# Altium footprint library SAMTEC SMD.PcbLib: 165 footprints (part 16 of 17) (continued)
## SAMTEC_SFM-105-02-S-D-APTR [mm] "10 Contacts - Pitch 1.27mm - Top Entry, Dual Row Surface Mount Receptacle With Alignment Pin"
height 4.75
pads (12):
  rect 0.73x2.2 smd: 1(-2.54,1.365) 2(-2.54,-1.365) 3(-1.27,1.365) 4(-1.27,-1.365) 5(0,1.365) 6(0,-1.365) 7(1.27,1.365) 8(1.27,-1.365) 9(2.54,1.365) 10(2.54,-1.365)
  round 0.5 hole 1.4 unplated mask+0.45: MEC1(-4.13,0) MEC2(4.13,0)
Top Overlay:
  circle w0.25: c-3.592,2.35 r0.125
  circle w0.25: c-3.592,2.35 r0.125
  lines w0.2: -3.366,-0.564 -3.366,-1.524 -3.31,-1.524 ; -3.366,0.564 -3.366,1.524 -3.31,1.524 ; 3.31,-2.159 3.365,-2.159 3.365,-1.524 ; 3.31,-1.524 3.365,-1.524 ; 3.31,1.524 3.365,1.524 3.365,0.564 ; 3.365,-0.564 3.365,-1.524
Mechanical 8:
  lines w0.1: -4.63,0 -4.13,0 ; -4.13,-0.5 -4.13,0 ; -4.13,0.5 -4.13,0 ; -3.63,0 -4.13,0 ; -3.04,-1.365 -2.54,-1.365 ; -3.04,1.365 -2.54,1.365 ; -2.54,-1.865 -2.54,-1.365 ; -2.54,-0.865 -2.54,-1.365 ; -2.54,0.865 -2.54,1.365 ; -2.54,1.865 -2.54,1.365 ; -2.04,-1.365 -2.54,-1.365 ; -2.04,1.365 -2.54,1.365 ; -1.77,-1.365 -1.27,-1.365 ; -1.77,1.365 -1.27,1.365 ; -1.27,-1.865 -1.27,-1.365 ; -1.27,-0.865 -1.27,-1.365 ; -1.27,0.865 -1.27,1.365 ; -1.27,1.865 -1.27,1.365 ; -0.77,-1.365 -1.27,-1.365 ; -0.77,1.365 -1.27,1.365 ; -0.5,-1.365 0,-1.365 ; -0.5,0 0,0 ; -0.5,1.365 0,1.365 ; 0,-1.865 0,-1.365 ; 0,-0.865 0,-1.365 ; 0,-0.5 0,0 ; 0,0.5 0,0 ; 0,0.865 0,1.365 ; 0,1.865 0,1.365 ; 0.5,-1.365 0,-1.365 ; 0.5,0 0,0 ; 0.5,1.365 0,1.365 ; 0.77,-1.365 1.27,-1.365 ; 0.77,1.365 1.27,1.365 ; 1.27,-1.865 1.27,-1.365 ; 1.27,-0.865 1.27,-1.365 ; 1.27,0.865 1.27,1.365 ; 1.27,1.865 1.27,1.365 ; 1.77,-1.365 1.27,-1.365 ; 1.77,1.365 1.27,1.365 ; 2.04,-1.365 2.54,-1.365 ; 2.04,1.365 2.54,1.365 ; 2.54,-1.865 2.54,-1.365 ; 2.54,-0.865 2.54,-1.365 ; 2.54,0.865 2.54,1.365 ; 2.54,1.865 2.54,1.365 ; 3.04,-1.365 2.54,-1.365 ; 3.04,1.365 2.54,1.365 ; 3.63,0 4.13,0 ; 4.13,-0.5 4.13,0 ; 4.13,0.5 4.13,0 ; 4.63,0 4.13,0 ; -2.91,-2.475 -2.17,-2.475 -2.17,-0.254 -2.91,-0.254 -2.91,-2.475 ; -2.91,0.254 -2.91,2.475 -2.17,2.475 -2.17,0.254 -2.91,0.254 ; -1.64,-2.475 -0.9,-2.475 -0.9,-0.254 -1.64,-0.254 -1.64,-2.475 ; -1.64,0.254 -1.64,2.475 -0.9,2.475 -0.9,0.254 -1.64,0.254 ; -0.37,-2.475 0.37,-2.475 0.37,-0.254 -0.37,-0.254 -0.37,-2.475 ; -0.37,0.254 -0.37,2.475 0.37,2.475 0.37,0.254 -0.37,0.254 ; 0.9,-2.475 1.64,-2.475 1.64,-0.254 0.9,-0.254 0.9,-2.475 ; 0.9,0.254 0.9,2.475 1.64,2.475 1.64,0.254 0.9,0.254 ; 2.17,-2.475 2.91,-2.475 2.91,-0.254 2.17,-0.254 2.17,-2.475 ; 2.17,0.254 2.17,2.475 2.91,2.475 2.91,0.254 2.17,0.254
Mechanical 14:
  lines w0.1: -3.366,-0.635 -4.763,-0.635 -4.763,0.635 -3.366,0.635 ; 1.333,-1.524 1.333,-2.159 3.366,-2.159 3.366,1.524 -3.366,1.524 -3.366,-1.524 3.366,-1.524 ; 3.366,-0.635 4.763,-0.635 4.763,0.635 3.366,0.635 ; -3.048,-1.143 -3.048,-0.127 ; -3.048,-1.143 -2.032,-1.143 ; -3.048,-1.143 -2.819,-0.914 ; -3.048,-0.127 -2.032,-0.127 ; -3.048,-0.127 -2.819,-0.356 ; -3.048,0.127 -3.048,1.143 ; -3.048,0.127 -2.032,0.127 ; -3.048,0.127 -2.819,0.356 ; -3.048,1.143 -2.032,1.143 ; -3.048,1.143 -2.819,0.914 ; -2.819,-0.914 -2.819,-0.356 ; -2.819,-0.914 -2.261,-0.914 ; -2.819,-0.356 -2.261,-0.356 ; -2.819,0.356 -2.819,0.914 ; -2.819,0.356 -2.261,0.356 ; -2.819,0.914 -2.261,0.914 ; -2.261,-0.914 -2.032,-1.143 ; -2.261,-0.914 -2.261,-0.356 ; -2.261,-0.356 -2.032,-0.127 ; -2.261,0.356 -2.032,0.127 ; -2.261,0.356 -2.261,0.914 ; -2.261,0.914 -2.032,1.143 ; -2.032,-1.143 -2.032,-0.127 ; -2.032,0.127 -2.032,1.143 ; -1.778,-1.143 -1.778,-0.127 ; -1.778,-1.143 -0.762,-1.143 ; -1.778,-1.143 -1.549,-0.914 ; -1.778,-0.127 -0.762,-0.127 ; -1.778,-0.127 -1.549,-0.356 ; -1.778,0.127 -1.778,1.143 ; -1.778,0.127 -0.762,0.127 ; -1.778,0.127 -1.549,0.356 ; -1.778,1.143 -0.762,1.143 ; -1.778,1.143 -1.549,0.914 ; -1.549,-0.914 -1.549,-0.356 ; -1.549,-0.914 -0.991,-0.914 ; -1.549,-0.356 -0.991,-0.356 ; -1.549,0.356 -1.549,0.914 ; -1.549,0.356 -0.991,0.356 ; -1.549,0.914 -0.991,0.914 ; -0.991,-0.914 -0.762,-1.143 ; -0.991,-0.914 -0.991,-0.356 ; -0.991,-0.356 -0.762,-0.127 ; -0.991,0.356 -0.762,0.127 ; -0.991,0.356 -0.991,0.914 ; -0.991,0.914 -0.762,1.143 ; -0.762,-1.143 -0.762,-0.127 ; -0.762,0.127 -0.762,1.143 ; -0.508,-1.143 -0.508,-0.127 ; -0.508,-1.143 0.508,-1.143 ; -0.508,-1.143 -0.279,-0.914 ; -0.508,-0.127 0.508,-0.127 ; -0.508,-0.127 -0.279,-0.356 ; -0.508,0.127 -0.508,1.143 ; -0.508,0.127 0.508,0.127 ; -0.508,0.127 -0.279,0.356 ; -0.508,1.143 0.508,1.143 ; -0.508,1.143 -0.279,0.914 ; -0.279,-0.914 -0.279,-0.356 ; -0.279,-0.914 0.279,-0.914 ; -0.279,-0.356 0.279,-0.356 ; -0.279,0.356 -0.279,0.914 ; -0.279,0.356 0.279,0.356 ; -0.279,0.914 0.279,0.914 ; 0.279,-0.914 0.508,-1.143 ; 0.279,-0.914 0.279,-0.356 ; 0.279,-0.356 0.508,-0.127 ; 0.279,0.356 0.508,0.127 ; 0.279,0.356 0.279,0.914 ; 0.279,0.914 0.508,1.143 ; 0.508,-1.143 0.508,-0.127 ; 0.508,0.127 0.508,1.143 ; 0.762,-1.143 0.762,-0.127 ; 0.762,-1.143 1.778,-1.143 ; 0.762,-1.143 0.991,-0.914 ; 0.762,-0.127 1.778,-0.127 ; 0.762,-0.127 0.991,-0.356 ; 0.762,0.127 0.762,1.143 ; 0.762,0.127 1.778,0.127 ; 0.762,0.127 0.991,0.356 ; 0.762,1.143 1.778,1.143 ; 0.762,1.143 0.991,0.914 ; 0.991,-0.914 0.991,-0.356 ; 0.991,-0.914 1.549,-0.914 ; 0.991,-0.356 1.549,-0.356 ; 0.991,0.356 0.991,0.914 ; 0.991,0.356 1.549,0.356 ; 0.991,0.914 1.549,0.914 ; 1.549,-0.914 1.778,-1.143 ; 1.549,-0.914 1.549,-0.356 ; 1.549,-0.356 1.778,-0.127 ; 1.549,0.356 1.778,0.127 ; 1.549,0.356 1.549,0.914 ; 1.549,0.914 1.778,1.143 ; 1.778,-1.143 1.778,-0.127 ; 1.778,0.127 1.778,1.143 ; 2.032,-1.143 2.032,-0.127 ; 2.032,-1.143 3.048,-1.143 ; 2.032,-1.143 2.261,-0.914 ; 2.032,-0.127 3.048,-0.127 ; 2.032,-0.127 2.261,-0.356 ; 2.032,0.127 2.032,1.143 ; 2.032,0.127 3.048,0.127 ; 2.032,0.127 2.261,0.356 ; 2.032,1.143 3.048,1.143 ; 2.032,1.143 2.261,0.914 ; 2.261,-0.914 2.261,-0.356 ; 2.261,-0.914 2.819,-0.914 ; 2.261,-0.356 2.819,-0.356 ; 2.261,0.356 2.261,0.914 ; 2.261,0.356 2.819,0.356 ; 2.261,0.914 2.819,0.914 ; 2.819,-0.914 3.048,-1.143 ; 2.819,-0.914 2.819,-0.356 ; 2.819,-0.356 3.048,-0.127 ; 2.819,0.356 3.048,0.127 ; 2.819,0.356 2.819,0.914 ; 2.819,0.914 3.048,1.143 ; 3.048,-1.143 3.048,-0.127 ; 3.048,0.127 3.048,1.143
Mechanical 15:
  lines w0.05: -5.013,-2.725 -5.013,2.725 5.013,2.725 5.013,-2.725 -5.013,-2.725
3D body "SAMTEC_SFM-105-02-S-D-APTR.stp": height 4.7, standoff -1.14, extent -4.765,-2.159 4.765,2.096

## SAMTEC_SFM-125-02-S-D-APTR [mm] "50 Contacts - Pitch 1.27mm - Top Entry, Dual Row Surface Mount Receptacle With Alignment Pin"
height 4.75
pads (52):
  rect 0.73x2.2 smd: 1(-15.24,1.365) 2(-15.24,-1.365) 3(-13.97,1.365) 4(-13.97,-1.365) 5(-12.7,1.365) 6(-12.7,-1.365) 7(-11.43,1.365) 8(-11.43,-1.365) 9(-10.16,1.365) 10(-10.16,-1.365) 11(-8.89,1.365) 12(-8.89,-1.365) 13(-7.62,1.365) 14(-7.62,-1.365) 15(-6.35,1.365) 16(-6.35,-1.365) 17(-5.08,1.365) 18(-5.08,-1.365) 19(-3.81,1.365) 20(-3.81,-1.365) 21(-2.54,1.365) 22(-2.54,-1.365) 23(-1.27,1.365) 24(-1.27,-1.365) 25(0,1.365) 26(0,-1.365) 27(1.27,1.365) 28(1.27,-1.365) 29(2.54,1.365) 30(2.54,-1.365) 31(3.81,1.365) 32(3.81,-1.365) 33(5.08,1.365) 34(5.08,-1.365) 35(6.35,1.365) 36(6.35,-1.365) 37(7.62,1.365) 38(7.62,-1.365) 39(8.89,1.365) 40(8.89,-1.365) 41(10.16,1.365) 42(10.16,-1.365) 43(11.43,1.365) 44(11.43,-1.365) 45(12.7,1.365) 46(12.7,-1.365) 47(13.97,1.365) 48(13.97,-1.365) 49(15.24,1.365) 50(15.24,-1.365)
  round 0.5 hole 1.4 unplated mask+0.45: MEC1(-16.83,0) MEC2(16.83,0)
Top Overlay:
  circle w0.25: c-16.292,2.35 r0.125
  circle w0.25: c-16.292,2.35 r0.125
  lines w0.2: -16.066,-0.564 -16.066,-1.524 -16.01,-1.524 ; -16.066,0.564 -16.066,1.524 -16.01,1.524 ; 16.01,-2.159 16.066,-2.159 16.066,-1.524 ; 16.01,-1.524 16.066,-1.524 ; 16.01,1.524 16.066,1.524 16.066,0.564 ; 16.066,-0.564 16.066,-1.524
Mechanical 8:
  drawing of 412 lines, arcs and shapes, not listed
Mechanical 14:
  drawing of 614 lines, arcs and shapes, not listed
Mechanical 15:
  lines w0.05: -17.713,-2.725 -17.713,2.725 17.713,2.725 17.713,-2.725 -17.713,-2.725
3D body "SAMTEC_SFM-125-02-S-D-APTR.stp": height 4.7, standoff -1.14, extent -17.465,-2.159 17.465,2.096

## SAMTEC_SFM-130-02-S-D-A [mm] "60 Contacts - Pitch 1.27mm - Top Entry, Dual Row Surface Mount Receptacle With Alignment Pin"
height 4.75
pads (62):
  rect 0.73x2.2 smd: 1(-18.415,1.365) 2(-18.415,-1.365) 3(-17.145,1.365) 4(-17.145,-1.365) 5(-15.875,1.365) 6(-15.875,-1.365) 7(-14.605,1.365) 8(-14.605,-1.365) 9(-13.335,1.365) 10(-13.335,-1.365) 11(-12.065,1.365) 12(-12.065,-1.365) 13(-10.795,1.365) 14(-10.795,-1.365) 15(-9.525,1.365) 16(-9.525,-1.365) 17(-8.255,1.365) 18(-8.255,-1.365) 19(-6.985,1.365) 20(-6.985,-1.365) 21(-5.715,1.365) 22(-5.715,-1.365) 23(-4.445,1.365) 24(-4.445,-1.365) 25(-3.175,1.365) 26(-3.175,-1.365) 27(-1.905,1.365) 28(-1.905,-1.365) 29(-0.635,1.365) 30(-0.635,-1.365) 31(0.635,1.365) 32(0.635,-1.365) 33(1.905,1.365) 34(1.905,-1.365) 35(3.175,1.365) 36(3.175,-1.365) 37(4.445,1.365) 38(4.445,-1.365) 39(5.715,1.365) 40(5.715,-1.365) 41(6.985,1.365) 42(6.985,-1.365) 43(8.255,1.365) 44(8.255,-1.365) 45(9.525,1.365) 46(9.525,-1.365) 47(10.795,1.365) 48(10.795,-1.365) 49(12.065,1.365) 50(12.065,-1.365) 51(13.335,1.365) 52(13.335,-1.365) 53(14.605,1.365) 54(14.605,-1.365) 55(15.875,1.365) 56(15.875,-1.365) 57(17.145,1.365) 58(17.145,-1.365) 59(18.415,1.365) 60(18.415,-1.365)
  round 0.5 hole 1.4 unplated mask+0.45: MEC1(-20,0) MEC2(20,0)
Top Overlay:
  circle w0.25: c-19.467,2.35 r0.125
  circle w0.25: c-19.467,2.35 r0.125
  lines w0.2: -19.236,-0.564 -19.236,-1.524 -19.18,-1.524 ; -19.236,0.564 -19.236,1.524 -19.18,1.524 ; 19.18,-2.159 19.236,-2.159 19.236,-1.524 ; 19.18,-1.524 19.236,-1.524 ; 19.18,1.524 19.236,1.524 19.236,0.564 ; 19.236,-0.564 19.236,-1.524
Mechanical 8:
  drawing of 209 lines, arcs and shapes, not listed
Mechanical 14:
  drawing of 741 lines, arcs and shapes, not listed
Mechanical 15:
  lines w0.1: -20.888,-2.725 -20.888,2.725 20.888,2.725 20.888,-2.725 -20.888,-2.725
3D body "SAMTEC_SFM-130-02-S-D-A.stp": height 4.7, standoff -1.14, extent -20.637,-2.159 20.638,2.096

## SAMTEC_SFML-130-T2-S-D-A [mm] "60 Contacts - Pitch 1.27mm - Top Entry, Dual Row Surface Mount Receptacle With Alignment Pin And Locking Tab"
height 4.57
pads (62):
  rect 0.73x2.2 smd: 1(-18.415,1.365) 2(-18.415,-1.365) 3(-17.145,1.365) 4(-17.145,-1.365) 5(-15.875,1.365) 6(-15.875,-1.365) 7(-14.605,1.365) 8(-14.605,-1.365) 9(-13.335,1.365) 10(-13.335,-1.365) 11(-12.065,1.365) 12(-12.065,-1.365) 13(-10.795,1.365) 14(-10.795,-1.365) 15(-9.525,1.365) 16(-9.525,-1.365) 17(-8.255,1.365) 18(-8.255,-1.365) 19(-6.985,1.365) 20(-6.985,-1.365) 21(-5.715,1.365) 22(-5.715,-1.365) 23(-4.445,1.365) 24(-4.445,-1.365) 25(-3.175,1.365) 26(-3.175,-1.365) 27(-1.905,1.365) 28(-1.905,-1.365) 29(-0.635,1.365) 30(-0.635,-1.365) 31(0.635,1.365) 32(0.635,-1.365) 33(1.905,1.365) 34(1.905,-1.365) 35(3.175,1.365) 36(3.175,-1.365) 37(4.445,1.365) 38(4.445,-1.365) 39(5.715,1.365) 40(5.715,-1.365) 41(6.985,1.365) 42(6.985,-1.365) 43(8.255,1.365) 44(8.255,-1.365) 45(9.525,1.365) 46(9.525,-1.365) 47(10.795,1.365) 48(10.795,-1.365) 49(12.065,1.365) 50(12.065,-1.365) 51(13.335,1.365) 52(13.335,-1.365) 53(14.605,1.365) 54(14.605,-1.365) 55(15.875,1.365) 56(15.875,-1.365) 57(17.145,1.365) 58(17.145,-1.365) 59(18.415,1.365) 60(18.415,-1.365)
  round 0.5 hole 1.4 unplated mask+0.45: MEC1(-20,0) MEC2(20,0)
Top Overlay:
  circle w0.25: c-19.467,2.35 r0.125
  circle w0.25: c-19.467,2.35 r0.125
  lines w0.2: -19.236,-0.564 -19.236,-1.524 -19.18,-1.524 ; -19.236,0.564 -19.236,1.524 -19.18,1.524 ; 19.18,-2.159 19.236,-2.159 19.236,-1.524 ; 19.18,-1.524 19.236,-1.524 ; 19.18,1.524 19.236,1.524 19.236,0.564 ; 19.236,-0.564 19.236,-1.524
Mechanical 8:
  drawing of 209 lines, arcs and shapes, not listed
Mechanical 14:
  drawing of 746 lines, arcs and shapes, not listed
Mechanical 15:
  lines w0.1: -20.888,-2.725 20.888,-2.725 20.888,2.725 -20.888,2.725 -20.888,-2.725
3D body "SAMTEC_SFML-130-T2-S-D-A.stp": height 4.7, standoff -1.14, extent -20.637,-2.21 20.638,2.096

## SAMTEC_SS4-20-3.00-L-D-K-TR [mm] "40 Contacts - Pitch 0.40 mm Razor Beam Ultra Fine Pitch Low Profile Socket Strip"
height 3.5
pads (40):
  rect 0.23x0.93 smd paste-0.02 mask+0.05: 1(3.8,2.335) 2(3.8,-2.335) 3(3.4,2.335) 4(3.4,-2.335) 5(3,2.335) 6(3,-2.335) 7(2.6,2.335) 8(2.6,-2.335) 9(2.2,2.335) 10(2.2,-2.335) 11(1.8,2.335) 12(1.8,-2.335) 13(1.4,2.335) 14(1.4,-2.335) 15(1,2.335) 16(1,-2.335) 17(0.6,2.335) 18(0.6,-2.335) 19(0.2,2.335) 20(0.2,-2.335) 21(-0.2,2.335) 22(-0.2,-2.335) 23(-0.6,2.335) 24(-0.6,-2.335) 25(-1,2.335) 26(-1,-2.335) 27(-1.4,2.335) 28(-1.4,-2.335) 29(-1.8,2.335) 30(-1.8,-2.335) 31(-2.2,2.335) 32(-2.2,-2.335) 33(-2.6,2.335) 34(-2.6,-2.335) 35(-3,2.335) 36(-3,-2.335) 37(-3.4,2.335) 38(-3.4,-2.335) 39(-3.8,2.335) 40(-3.8,-2.335)
Top Overlay:
  drawing of 240 lines, arcs and shapes, not listed
  text "1" at 5.1,1.375 h1
  text "2" at 5.075,-2.375 h1
Mechanical 8:
  drawing of 244 lines, arcs and shapes, not listed
Mechanical 14:
  drawing of 412 lines, arcs and shapes, not listed
  text "1" at 5.1,1.375 h1
  text "2" at 5.075,-2.375 h1
Mechanical 15:
  lines w0.05: -5.81,-2.425 -4.165,-2.425 -4.165,-3.05 4.165,-3.05 4.165,-2.425 4.88,-2.425 4.88,-1.15 5.48,-1.15 5.48,-0.75 6.23,-0.75 6.23,0.75 5.48,0.75 5.48,1.15 4.88,1.15 4.88,2.425 4.165,2.425 4.165,3.05 -4.165,3.05 -4.165,2.425 -5.81,2.425 -5.81,-2.425
3D body "SAMTEC_SS4-20-3.00-L-D-K-TR.stp": height 3.5, standoff 0, extent -5.56,-2.5 5.98,2.5

## SAMTEC_SS4-20-3.00-L-D-K-TR_A [mm] "40 Contacts - Pitch 0.40 mm Razor Beam Ultra Fine Pitch Low Profile Socket Strip"
height 3.5
pads (40):
  rect 0.23x0.93 smd paste-0.02 mask+0.05: 1(3.8,2.335) 2(3.4,2.335) 3(3,2.335) 4(2.6,2.335) 5(2.2,2.335) 6(1.8,2.335) 7(1.4,2.335) 8(1,2.335) 9(0.6,2.335) 10(0.2,2.335) 11(-0.2,2.335) 12(-0.6,2.335) 13(-1,2.335) 14(-1.4,2.335) 15(-1.8,2.335) 16(-2.2,2.335) 17(-2.6,2.335) 18(-3,2.335) 19(-3.4,2.335) 20(-3.8,2.335) 21(-3.8,-2.335) 22(-3.4,-2.335) 23(-3,-2.335) 24(-2.6,-2.335) 25(-2.2,-2.335) 26(-1.8,-2.335) 27(-1.4,-2.335) 28(-1,-2.335) 29(-0.6,-2.335) 30(-0.2,-2.335) 31(0.2,-2.335) 32(0.6,-2.335) 33(1,-2.335) 34(1.4,-2.335) 35(1.8,-2.335) 36(2.2,-2.335) 37(2.6,-2.335) 38(3,-2.335) 39(3.4,-2.335) 40(3.8,-2.335)
Top Overlay:
  drawing of 240 lines, arcs and shapes, not listed
  text "40" at 5.075,-2.375 h1
  text "1" at 5.1,1.375 h1
Mechanical 8:
  drawing of 244 lines, arcs and shapes, not listed
Mechanical 14:
  drawing of 412 lines, arcs and shapes, not listed
  text "40" at 5.075,-2.375 h1
  text "1" at 5.1,1.375 h1
Mechanical 15:
  lines w0.05: -5.81,-2.425 -5.81,2.425 -4.165,2.425 -4.165,3.05 4.165,3.05 4.165,2.425 4.88,2.425 4.88,1.15 5.48,1.15 5.48,0.75 6.23,0.75 6.23,-0.75 5.48,-0.75 5.48,-1.15 4.88,-1.15 4.88,-2.425 4.165,-2.425 4.165,-3.05 -4.165,-3.05 -4.165,-2.425 -5.81,-2.425
3D body "SAMTEC_SS4-20-3.00-L-D-K-TR.stp": height 3.5, standoff 0, extent -5.56,-2.5 5.98,2.5

## SAMTEC_SS4-20-3.00-L-D-TR [mm] "40 Contacts - Pitch 0.40 mm Razor Beam Ultra Fine Pitch Low Profile Socket Strip"
height 3.5
pads (40):
  rect 0.23x0.93 smd paste-0.02 mask+0.05: 1(3.8,2.335) 2(3.8,-2.335) 3(3.4,2.335) 4(3.4,-2.335) 5(3,2.335) 6(3,-2.335) 7(2.6,2.335) 8(2.6,-2.335) 9(2.2,2.335) 10(2.2,-2.335) 11(1.8,2.335) 12(1.8,-2.335) 13(1.4,2.335) 14(1.4,-2.335) 15(1,2.335) 16(1,-2.335) 17(0.6,2.335) 18(0.6,-2.335) 19(0.2,2.335) 20(0.2,-2.335) 21(-0.2,2.335) 22(-0.2,-2.335) 23(-0.6,2.335) 24(-0.6,-2.335) 25(-1,2.335) 26(-1,-2.335) 27(-1.4,2.335) 28(-1.4,-2.335) 29(-1.8,2.335) 30(-1.8,-2.335) 31(-2.2,2.335) 32(-2.2,-2.335) 33(-2.6,2.335) 34(-2.6,-2.335) 35(-3,2.335) 36(-3,-2.335) 37(-3.4,2.335) 38(-3.4,-2.335) 39(-3.8,2.335) 40(-3.8,-2.335)
Top Overlay:
  drawing of 240 lines, arcs and shapes, not listed
  text "2" at 5.075,-2.375 h1
  text "1" at 5.1,1.375 h1
Mechanical 8:
  drawing of 244 lines, arcs and shapes, not listed
Mechanical 14:
  drawing of 412 lines, arcs and shapes, not listed
  text "2" at 5.075,-2.375 h1
  text "1" at 5.1,1.375 h1
Mechanical 15:
  lines w0.05: -5.81,-2.425 -4.165,-2.425 -4.165,-3.05 4.165,-3.05 4.165,-2.425 4.88,-2.425 4.88,-1.15 5.48,-1.15 5.48,-0.75 6.23,-0.75 6.23,0.75 5.48,0.75 5.48,1.15 4.88,1.15 4.88,2.425 4.165,2.425 4.165,3.05 -4.165,3.05 -4.165,2.425 -5.81,2.425 -5.81,-2.425
3D body "SAMTEC_SS4-20-3.00-L-D-TR.stp": height 3.5, standoff 0, extent -5.56,-2.5 5.98,2.5

## SAMTEC_SS4-40-3.00-L-D-K-TR [mm] "80 Contacts - Pitch 0.40 mm Razor Beam Ultra Fine Pitch Low Profile Socket Strip"
height 3.5
pads (80):
  rect 0.23x0.93 smd paste-0.02 mask+0.05: 1(7.8,2.335) 2(7.8,-2.335) 3(7.4,2.335) 4(7.4,-2.335) 5(7,2.335) 6(7,-2.335) 7(6.6,2.335) 8(6.6,-2.335) 9(6.2,2.335) 10(6.2,-2.335) 11(5.8,2.335) 12(5.8,-2.335) 13(5.4,2.335) 14(5.4,-2.335) 15(5,2.335) 16(5,-2.335) 17(4.6,2.335) 18(4.6,-2.335) 19(4.2,2.335) 20(4.2,-2.335) 21(3.8,2.335) 22(3.8,-2.335) 23(3.4,2.335) 24(3.4,-2.335) 25(3,2.335) 26(3,-2.335) 27(2.6,2.335) 28(2.6,-2.335) 29(2.2,2.335) 30(2.2,-2.335) 31(1.8,2.335) 32(1.8,-2.335) 33(1.4,2.335) 34(1.4,-2.335) 35(1,2.335) 36(1,-2.335) 37(0.6,2.335) 38(0.6,-2.335) 39(0.2,2.335) 40(0.2,-2.335) 41(-0.2,2.335) 42(-0.2,-2.335) 43(-0.6,2.335) 44(-0.6,-2.335) 45(-1,2.335) 46(-1,-2.335) 47(-1.4,2.335) 48(-1.4,-2.335) 49(-1.8,2.335) 50(-1.8,-2.335) 51(-2.2,2.335) 52(-2.2,-2.335) 53(-2.6,2.335) 54(-2.6,-2.335) 55(-3,2.335) 56(-3,-2.335) 57(-3.4,2.335) 58(-3.4,-2.335) 59(-3.8,2.335) 60(-3.8,-2.335) 61(-4.2,2.335) 62(-4.2,-2.335) 63(-4.6,2.335) 64(-4.6,-2.335) 65(-5,2.335) 66(-5,-2.335) 67(-5.4,2.335) 68(-5.4,-2.335) 69(-5.8,2.335) 70(-5.8,-2.335) 71(-6.2,2.335) 72(-6.2,-2.335) 73(-6.6,2.335) 74(-6.6,-2.335) 75(-7,2.335) 76(-7,-2.335) 77(-7.4,2.335) 78(-7.4,-2.335) 79(-7.8,2.335) 80(-7.8,-2.335)
Top Overlay:
  drawing of 400 lines, arcs and shapes, not listed
  text "1" at 9.1,1.375 h1
  text "2" at 9.075,-2.375 h1
Mechanical 8:
  drawing of 514 lines, arcs and shapes, not listed
Mechanical 14:
  drawing of 732 lines, arcs and shapes, not listed
  text "1" at 9.1,1.375 h1
  text "2" at 9.075,-2.375 h1
Mechanical 15:
  lines w0.05: -9.81,-2.425 -9.81,2.425 -8.165,2.425 -8.165,3.05 8.165,3.05 8.165,2.425 8.88,2.425 8.88,1.15 9.48,1.15 9.48,0.75 10.23,0.75 10.23,-0.75 9.48,-0.75 9.48,-1.15 8.88,-1.15 8.88,-2.425 8.165,-2.425 8.165,-3.05 -8.165,-3.05 -8.165,-2.425 -9.81,-2.425
3D body "SAMTEC_SS4-40-3.00-L-D-K-TR.stp": height 3.5, standoff 0, extent -9.56,-2.5 9.98,2.5

## SAMTEC_SS4-40-3.00-L-D-K-TR_a [mm] "80 Contacts - Pitch 0.40 mm Razor Beam Ultra Fine Pitch Low Profile Socket Strip"
height 3.5
pads (80):
  rect 0.23x0.93 smd paste-0.02 mask+0.05: 1(7.8,2.335) 2(7.4,2.335) 3(7,2.335) 4(6.6,2.335) 5(6.2,2.335) 6(5.8,2.335) 7(5.4,2.335) 8(5,2.335) 9(4.6,2.335) 10(4.2,2.335) 11(3.8,2.335) 12(3.4,2.335) 13(3,2.335) 14(2.6,2.335) 15(2.2,2.335) 16(1.8,2.335) 17(1.4,2.335) 18(1,2.335) 19(0.6,2.335) 20(0.2,2.335) 21(-0.2,2.335) 22(-0.6,2.335) 23(-1,2.335) 24(-1.4,2.335) 25(-1.8,2.335) 26(-2.2,2.335) 27(-2.6,2.335) 28(-3,2.335) 29(-3.4,2.335) 30(-3.8,2.335) 31(-4.2,2.335) 32(-4.6,2.335) 33(-5,2.335) 34(-5.4,2.335) 35(-5.8,2.335) 36(-6.2,2.335) 37(-6.6,2.335) 38(-7,2.335) 39(-7.4,2.335) 40(-7.8,2.335) 41(-7.8,-2.335) 42(-7.4,-2.335) 43(-7,-2.335) 44(-6.6,-2.335) 45(-6.2,-2.335) 46(-5.8,-2.335) 47(-5.4,-2.335) 48(-5,-2.335) 49(-4.6,-2.335) 50(-4.2,-2.335) 51(-3.8,-2.335) 52(-3.4,-2.335) 53(-3,-2.335) 54(-2.6,-2.335) 55(-2.2,-2.335) 56(-1.8,-2.335) 57(-1.4,-2.335) 58(-1,-2.335) 59(-0.6,-2.335) 60(-0.2,-2.335) 61(0.2,-2.335) 62(0.6,-2.335) 63(1,-2.335) 64(1.4,-2.335) 65(1.8,-2.335) 66(2.2,-2.335) 67(2.6,-2.335) 68(3,-2.335) 69(3.4,-2.335) 70(3.8,-2.335) 71(4.2,-2.335) 72(4.6,-2.335) 73(5,-2.335) 74(5.4,-2.335) 75(5.8,-2.335) 76(6.2,-2.335) 77(6.6,-2.335) 78(7,-2.335) 79(7.4,-2.335) 80(7.8,-2.335)
Top Overlay:
  drawing of 400 lines, arcs and shapes, not listed
  text "1" at 9.1,1.375 h1
Mechanical 8:
  drawing of 514 lines, arcs and shapes, not listed
Mechanical 14:
  drawing of 732 lines, arcs and shapes, not listed
  text "80" at 10.075,-3.025 h1
  text "1" at 9.1,1.375 h1
Mechanical 15:
  lines w0.05: -9.81,-2.425 -8.165,-2.425 -8.165,-3.05 8.165,-3.05 8.165,-2.425 8.88,-2.425 8.88,-1.15 9.48,-1.15 9.48,-0.75 10.23,-0.75 10.23,0.75 9.48,0.75 9.48,1.15 8.88,1.15 8.88,2.425 8.165,2.425 8.165,3.05 -8.165,3.05 -8.165,2.425 -9.81,2.425 -9.81,-2.425
3D body "SAMTEC_SS4-40-3.00-L-D-K-TR.stp": height 3.5, standoff 0, extent -9.56,-2.5 9.98,2.5

## SAMTEC_ST4-20-1.00-L-D-P-TR [mm] "40 Contacts - Pitch 0.40 mm Razor Beam Ultra Fine Pitch Low Profile Header Strip"
height 3.08
pads (40):
  rect 0.23x1.2 smd paste-0.02 mask+0.05: 1(-3.8,1.71) 2(-3.8,-1.71) 3(-3.4,1.71) 4(-3.4,-1.71) 5(-3,1.71) 6(-3,-1.71) 7(-2.6,1.71) 8(-2.6,-1.71) 9(-2.2,1.71) 10(-2.2,-1.71) 11(-1.8,1.71) 12(-1.8,-1.71) 13(-1.4,1.71) 14(-1.4,-1.71) 15(-1,1.71) 16(-1,-1.71) 17(-0.6,1.71) 18(-0.6,-1.71) 19(-0.2,1.71) 20(-0.2,-1.71) 21(0.2,1.71) 22(0.2,-1.71) 23(0.6,1.71) 24(0.6,-1.71) 25(1,1.71) 26(1,-1.71) 27(1.4,1.71) 28(1.4,-1.71) 29(1.8,1.71) 30(1.8,-1.71) 31(2.2,1.71) 32(2.2,-1.71) 33(2.6,1.71) 34(2.6,-1.71) 35(3,1.71) 36(3,-1.71) 37(3.4,1.71) 38(3.4,-1.71) 39(3.8,1.71) 40(3.8,-1.71)
Top Overlay:
  drawing of 210 lines, arcs and shapes, not listed
Mechanical 8:
  drawing of 244 lines, arcs and shapes, not listed
Mechanical 14:
  drawing of 219 lines, arcs and shapes, not listed
Mechanical 15:
  lines w0.05: -5.125,-2.1 -5.125,2.1 -4.165,2.1 -4.165,2.56 4.375,2.56 4.375,0.928 4.95,0.928 4.95,-0.928 4.375,-0.928 4.375,-2.56 -4.165,-2.56 -4.165,-2.1 -5.125,-2.1
3D body "SAMTEC_ST4-20-1.00-L-D-P-TR.stp": height 3.08, standoff 0, extent -4.875,-1.998 4.7,1.998

## SAMTEC_ST4-40-1.00-L-D-P-TR [mm] "80 Contacts - Pitch 0.40 mm Razor Beam Ultra Fine Pitch Low Profile Header Strip"
height 3.08
pads (80):
  rect 0.23x1.2 smd paste-0.02 mask+0.05: 1(-7.8,1.71) 2(-7.8,-1.71) 3(-7.4,1.71) 4(-7.4,-1.71) 5(-7,1.71) 6(-7,-1.71) 7(-6.6,1.71) 8(-6.6,-1.71) 9(-6.2,1.71) 10(-6.2,-1.71) 11(-5.8,1.71) 12(-5.8,-1.71) 13(-5.4,1.71) 14(-5.4,-1.71) 15(-5,1.71) 16(-5,-1.71) 17(-4.6,1.71) 18(-4.6,-1.71) 19(-4.2,1.71) 20(-4.2,-1.71) 21(-3.8,1.71) 22(-3.8,-1.71) 23(-3.4,1.71) 24(-3.4,-1.71) 25(-3,1.71) 26(-3,-1.71) 27(-2.6,1.71) 28(-2.6,-1.71) 29(-2.2,1.71) 30(-2.2,-1.71) 31(-1.8,1.71) 32(-1.8,-1.71) 33(-1.4,1.71) 34(-1.4,-1.71) 35(-1,1.71) 36(-1,-1.71) 37(-0.6,1.71) 38(-0.6,-1.71) 39(-0.2,1.71) 40(-0.2,-1.71) 41(0.2,1.71) 42(0.2,-1.71) 43(0.6,1.71) 44(0.6,-1.71) 45(1,1.71) 46(1,-1.71) 47(1.4,1.71) 48(1.4,-1.71) 49(1.8,1.71) 50(1.8,-1.71) 51(2.2,1.71) 52(2.2,-1.71) 53(2.6,1.71) 54(2.6,-1.71) 55(3,1.71) 56(3,-1.71) 57(3.4,1.71) 58(3.4,-1.71) 59(3.8,1.71) 60(3.8,-1.71) 61(4.2,1.71) 62(4.2,-1.71) 63(4.6,1.71) 64(4.6,-1.71) 65(5,1.71) 66(5,-1.71) 67(5.4,1.71) 68(5.4,-1.71) 69(5.8,1.71) 70(5.8,-1.71) 71(6.2,1.71) 72(6.2,-1.71) 73(6.6,1.71) 74(6.6,-1.71) 75(7,1.71) 76(7,-1.71) 77(7.4,1.71) 78(7.4,-1.71) 79(7.8,1.71) 80(7.8,-1.71)
Top Overlay:
  drawing of 358 lines, arcs and shapes, not listed
Mechanical 8:
  drawing of 488 lines, arcs and shapes, not listed
Mechanical 14:
  drawing of 367 lines, arcs and shapes, not listed
Mechanical 15:
  lines w0.05: -8.95,-2.56 -8.95,2.56 8.375,2.56 8.375,0.928 8.95,0.928 8.95,-0.928 8.375,-0.928 8.375,-2.56 -8.95,-2.56
3D body "SAMTEC_ST4-40-1.00-L-D-P-TR.stp": height 3.08, standoff 0, extent -8.875,-1.998 8.7,1.998

## SAMTEC_T2M-107-01-L-D-SM-K-TR [mm] "14 Contacts, Pitch 2mm, Dual Row Surface Mount Tiger Eye High-reliability Cable Header"
height 6.55
pads (14):
  rect 1.02x3.8 smd: 1(-6,-2.535) 2(-6,2.535) 3(-4,-2.535) 4(-4,2.535) 5(-2,-2.535) 6(-2,2.535) 7(0,-2.535) 8(0,2.535) 9(2,-2.535) 10(2,2.535) 11(4,-2.535) 12(4,2.535) 13(6,-2.535) 14(6,2.535)
Top Overlay:
  circle w0.25: c-6,-4.985 r0.125
  lines w0.2: -9.512,1.207 -9.077,1.207 ; -9.077,-1.003 -8.793,-1.003 ; -9.077,1.003 -8.793,1.003 ; -8.793,-1.207 -7.275,-1.207 ; -8.793,1.207 -7.275,1.207 ; -8.312,-1.207 -8.312,-2 -9.512,-2 -9.512,2 -8.312,2 -8.312,1.207 ; -6.86,-3.915 -8.064,-3.915 -8.064,-2.735 -9.837,-2.735 -9.837,3.015 -8.066,3.015 -8.066,3.523 -7.177,3.523 -7.177,3.015 -6.86,3.015 ; -6.86,-3.155 -7.275,-3.155 -7.275,2.255 -6.86,2.255 ; 6.86,-3.915 8.064,-3.915 8.064,-2.735 9.837,-2.735 9.837,3.015 8.066,3.015 8.066,3.523 7.177,3.523 7.177,3.015 6.86,3.015 ; 6.86,-3.155 7.275,-3.155 7.275,2.255 6.86,2.255 ; 7.275,-1.207 8.793,-1.207 ; 7.275,1.207 8.793,1.207 ; 8.312,-1.207 8.312,-2 9.512,-2 9.512,2 8.312,2 8.312,1.207 ; 8.793,-1.003 9.077,-1.003 ; 8.793,1.003 9.077,1.003 ; 9.077,-1.207 9.512,-1.207 ; 9.077,1.207 9.512,1.207 ; -9.077,-1.702 -8.793,-1.702 -8.793,1.702 -9.077,1.702 -9.077,-1.702 ; 8.793,-1.702 8.793,1.702 9.077,1.702 9.077,-1.702 8.793,-1.702
Mechanical 8:
  lines w0.05: -0.5,0 0,0 ; 0,-0.5 0,0 ; 0,0.5 0,0 ; 0.5,0 0,0 ; -6.51,-4.435 -6,-2.535 -5.49,-4.435 ; -6.51,-4.435 -6.51,-0.635 -5.49,-0.635 -5.49,-4.435 ; -6.51,-4.435 -5.49,-4.435 ; -6.51,4.435 -6,2.535 -5.49,4.435 ; -6.51,4.435 -6.51,0.635 -5.49,0.635 -5.49,4.435 ; -6.51,4.435 -5.49,4.435 ; -4.51,-4.435 -4,-2.535 -3.49,-4.435 ; -4.51,-4.435 -4.51,-0.635 -3.49,-0.635 -3.49,-4.435 ; -4.51,-4.435 -3.49,-4.435 ; -4.51,4.435 -4,2.535 -3.49,4.435 ; -4.51,4.435 -4.51,0.635 -3.49,0.635 -3.49,4.435 ; -4.51,4.435 -3.49,4.435 ; -2.51,-4.435 -2,-2.535 -1.49,-4.435 ; -2.51,-4.435 -2.51,-0.635 -1.49,-0.635 -1.49,-4.435 ; -2.51,-4.435 -1.49,-4.435 ; -2.51,4.435 -2,2.535 -1.49,4.435 ; -2.51,4.435 -2.51,0.635 -1.49,0.635 -1.49,4.435 ; -2.51,4.435 -1.49,4.435 ; -0.51,-4.435 0,-2.535 0.51,-4.435 ; -0.51,-4.435 -0.51,-0.635 0.51,-0.635 0.51,-4.435 ; -0.51,-4.435 0.51,-4.435 ; -0.51,4.435 0,2.535 0.51,4.435 ; -0.51,4.435 -0.51,0.635 0.51,0.635 0.51,4.435 ; -0.51,4.435 0.51,4.435 ; 1.49,-4.435 2,-2.535 2.51,-4.435 ; 1.49,-4.435 1.49,-0.635 2.51,-0.635 2.51,-4.435 ; 1.49,-4.435 2.51,-4.435 ; 1.49,4.435 2,2.535 2.51,4.435 ; 1.49,4.435 1.49,0.635 2.51,0.635 2.51,4.435 ; 1.49,4.435 2.51,4.435 ; 3.49,-4.435 4,-2.535 4.51,-4.435 ; 3.49,-4.435 3.49,-0.635 4.51,-0.635 4.51,-4.435 ; 3.49,-4.435 4.51,-4.435 ; 3.49,4.435 4,2.535 4.51,4.435 ; 3.49,4.435 3.49,0.635 4.51,0.635 4.51,4.435 ; 3.49,4.435 4.51,4.435 ; 5.49,-4.435 6,-2.535 6.51,-4.435 ; 5.49,-4.435 5.49,-0.635 6.51,-0.635 6.51,-4.435 ; 5.49,-4.435 6.51,-4.435 ; 5.49,4.435 6,2.535 6.51,4.435 ; 5.49,4.435 5.49,0.635 6.51,0.635 6.51,4.435 ; 5.49,4.435 6.51,4.435
Mechanical 14:
  drawing of 276 lines, arcs and shapes, not listed
Mechanical 15:
  lines w0.05: -10.087,-4.685 -10.087,4.685 10.087,4.685 10.087,-4.685 -10.087,-4.685
3D body "SAMTEC_T2M-107-01-L-D-SM-K-TR.stp": height 6.55, standoff 0, extent -9.837,-4.313 9.837,4.314